# Altium footprint library S61.PcbLib: 33 footprints (part 1 of 3)
Each footprint in its own frame and in the unit in brackets; x right, y up, seen from the top. Pads: shape width x height; smd on the part's side, far side on the other; paste and mask are expansions set on the pad; w line width, h text height; cw(c..) or ccw(c..) is an arc to the next point about the centre after c.
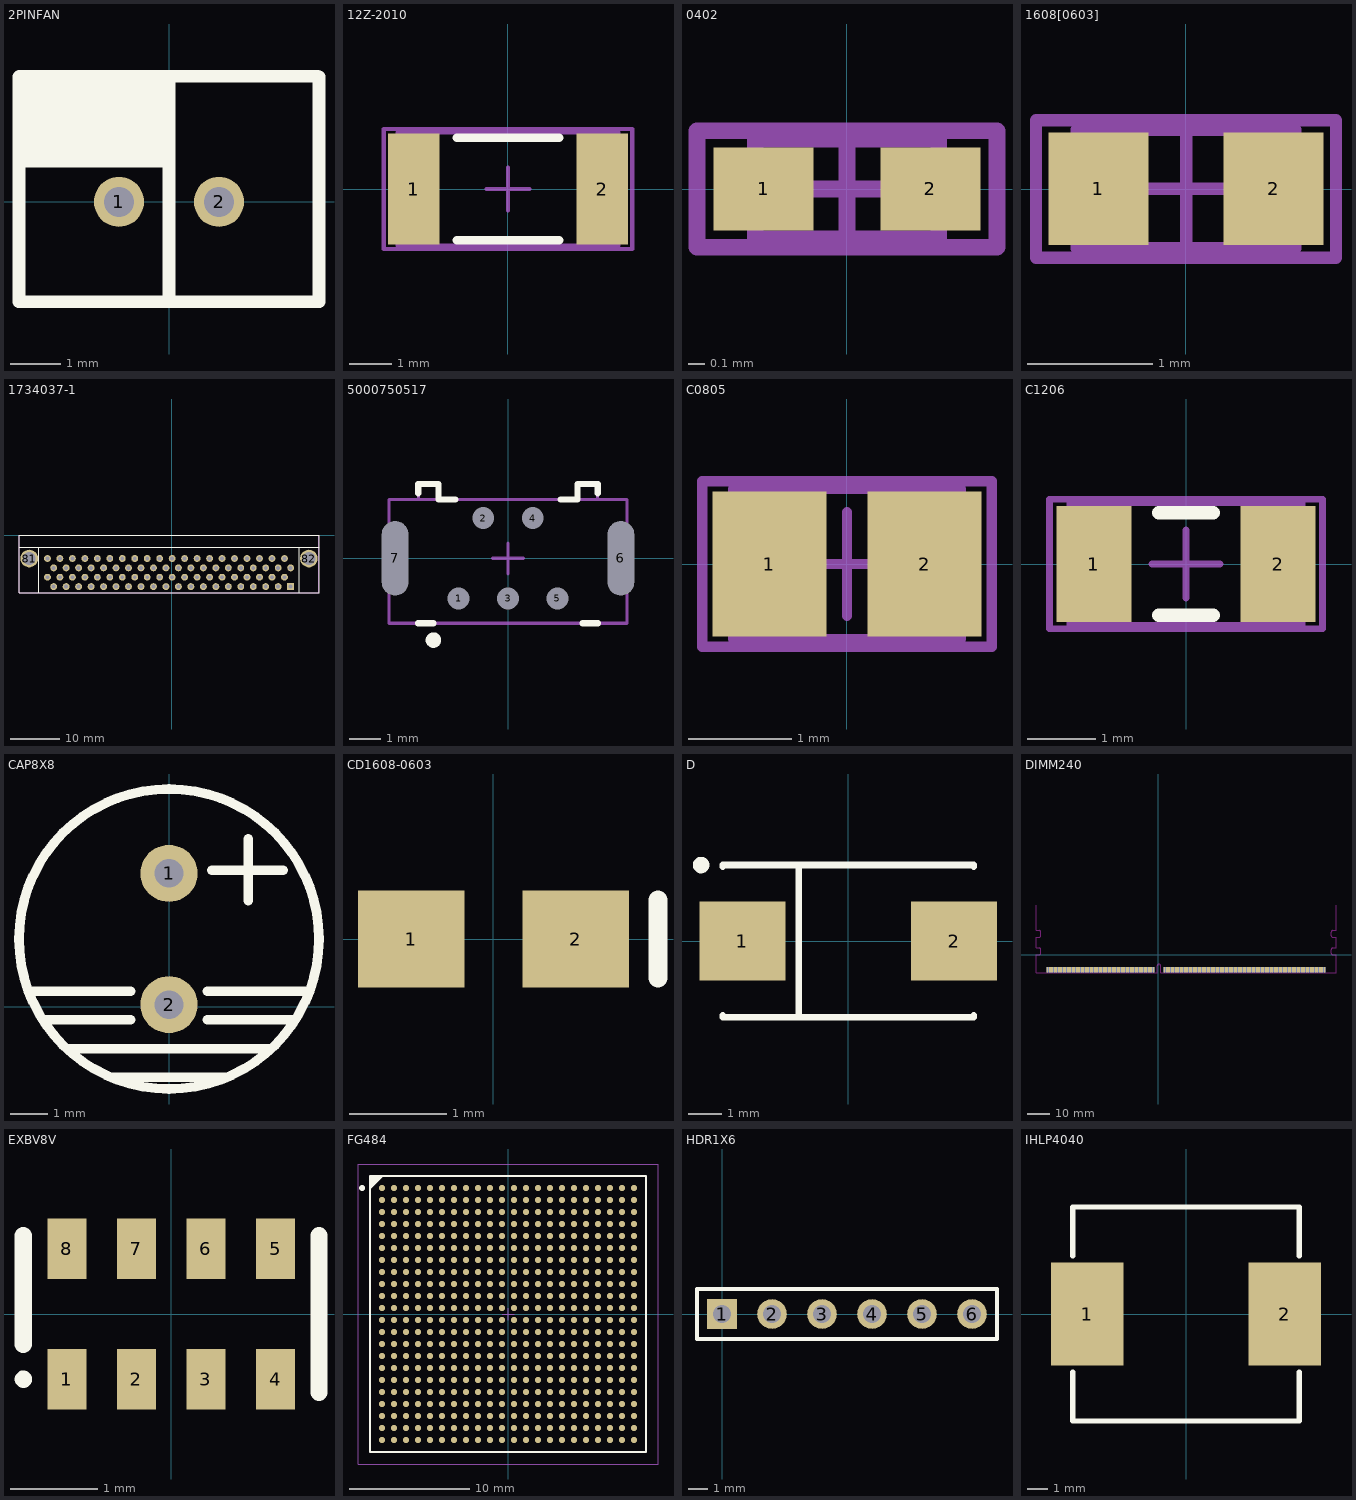
[diagram p0: the footprints below, top view; thin cyan lines are the x and y axes]

## 2PINFAN [mm]
pads (2):
  round 1 hole 0.6: 1(-1,0) 2(1,0)
Top Overlay:
  rectangle: -2.997,0.686 -0.025,2.489
  lines w0.254: -3,2.5 -3,-2 3,-2 3,2.5 ; -2.997,2.515 2.972,2.515 ; 0,-1.956 0,2.464

## 12Z-2010 [mm] "Chip Resistor, Body 5.0x2.5mm, IPC High Density"
height 0.9
pads (2):
  rect 1.2x2.6 smd: 1(-2.2,0) 2(2.2,0)
Top Overlay:
  lines w0.2: -1.2,-1.2 1.2,-1.2 ; -1.2,1.2 1.2,1.2
Mechanical 13:
  lines w0.1: -2.575,-1.325 -2.575,1.325 2.575,1.325 2.575,-1.325 -2.575,-1.325
Mechanical 15:
  lines w0.1: -0.5,0 0.5,0 ; 0,-0.5 0,0.5 ; -2.9,-1.4 -2.9,1.4 2.9,1.4 2.9,-1.4 -2.9,-1.4
3D body: height 0.9, standoff 0, extent -2.575,-1.325 2.575,1.325

## 0402 [mm] "Chip Capacitor, Body 1.0x0.5mm, IPC High Density"
height 1.3
pads (2):
  rect 0.6x0.5 smd: 1(-0.5,0) 2(0.5,0)
Mechanical 13:
  lines w0.1: -0.55,-0.3 -0.55,0.3 0.55,0.3 0.55,-0.3 -0.55,-0.3
Mechanical 15:
  lines w0.1: -0.3,0 0.3,0 ; 0,-0.3 0,0.3 ; -0.9,-0.35 -0.9,0.35 0.9,0.35 0.9,-0.35 -0.9,-0.35
3D body: height 1.3, standoff 0, extent -0.55,-0.3 0.55,0.3

## 1608[0603] [mm] "Chip Capacitor, Body 1.6x0.8mm, IPC High Density"
height 1.3
pads (2):
  rect 0.8x0.9 smd: 1(-0.7,0) 2(0.7,0)
Mechanical 13:
  lines w0.1: -0.875,-0.475 -0.875,0.475 0.875,0.475 0.875,-0.475 -0.875,-0.475
Mechanical 15:
  lines w0.1: -0.475,0 0.475,0 ; 0,-0.475 0,0.475 ; -1.2,-0.55 -1.2,0.55 1.2,0.55 1.2,-0.55 -1.2,-0.55
3D body: height 1.3, standoff 0, extent -0.875,-0.475 0.875,0.475

## 1734037-1 [mm]
pads (82):
  rect 1.4x1.4 hole 0.8: 1(24.257,-10.5)
  round 1.4 hole 0.8: 2(22.987,-8.595) 3(21.717,-10.5) 4(20.447,-8.595) 5(19.177,-10.5) 6(17.907,-8.595) 7(16.637,-10.5) 8(15.367,-8.595) 9(14.097,-10.5) 10(12.827,-8.595) 11(11.557,-10.5) 12(10.287,-8.595) 13(9.017,-10.5) 14(7.747,-8.595) 15(6.477,-10.5) 16(5.207,-8.595) 17(3.937,-10.5) 18(2.667,-8.595) 19(1.397,-10.5) 20(0.127,-8.595) 21(-1.143,-10.5) 22(-2.413,-8.595) 23(-3.683,-10.5) 24(-4.953,-8.595) 25(-6.223,-10.5) 26(-7.493,-8.595) 27(-8.763,-10.5) 28(-10.033,-8.595) 29(-11.303,-10.5) 30(-12.573,-8.595) 31(-13.843,-10.5) 32(-15.113,-8.595) 33(-16.383,-10.5) 34(-17.653,-8.595) 35(-18.923,-10.5) 36(-20.193,-8.595) 37(-21.463,-10.5) 38(-22.733,-8.595) 39(-24.003,-10.5) 40(-25.273,-8.595) 41(24.257,-6.69) 42(22.987,-4.785) 43(21.717,-6.69) 44(20.447,-4.785) 45(19.177,-6.69) 46(17.907,-4.785) 47(16.637,-6.69) 48(15.367,-4.785) 49(14.097,-6.69) 50(12.827,-4.785) 51(11.557,-6.69) 52(10.287,-4.785) 53(9.017,-6.69) 54(7.747,-4.785) 55(6.477,-6.69) 56(5.207,-4.785) 57(3.937,-6.69) 58(2.667,-4.785) 59(1.397,-6.69) 60(0.127,-4.785) 61(-1.143,-6.69) 62(-2.413,-4.785) 63(-3.683,-6.69) 64(-4.953,-4.785) 65(-6.223,-6.69) 66(-7.493,-4.785) 67(-8.763,-6.69) 68(-10.033,-4.785) 69(-11.303,-6.69) 70(-12.573,-4.785) 71(-13.843,-6.69) 72(-15.113,-4.785) 73(-16.383,-6.69) 74(-17.653,-4.785) 75(-18.923,-6.69) 76(-20.193,-4.785) 77(-21.463,-6.69) 78(-22.733,-4.785) 79(-24.003,-6.69) 80(-25.273,-4.785)
  round 3.6 hole 2.6: 81(-28.981,-4.785) 82(27.965,-4.785)
Top Overlay:
  lines w0.2: -31.039,-2.5 30.023,-2.5 ; -27.028,-11.8 -27.028,-2.58 ; 26.012,-11.8 26.012,-2.5 ; -31.039,-11.8 -31.039,0 30.023,0 30.023,-11.8 -31.039,-11.8
Mechanical 13:
  lines w0.1: -31.064,-2.5 30.023,-2.5 ; -31.039,0 29.972,0 ; -31.039,0 29.972,0 ; -31.039,0 -31.039,-11.8 29.972,-11.8 29.972,0

## 5000750517 [mm] "Connector; USB Mini-B, Type 2, Thru-Hole; 5 Position; Vertical"
height 7.7
pads (7):
  round 0.4 / inner round 0.4 / far side oval 1.1x1.7 hole 0.7: 1(-1.6,-1.3) 2(-0.8,1.3) 3(0,-1.3) 4(0.8,1.3) 5(1.6,-1.3)
  oval 0.55x2.1 / inner oval 0.55x2.1 / far side oval 1.6x3.9 hole 0.85 slot 2.4 at 90 deg: 6(3.65,0) 7(-3.65,0)
Top Overlay:
  circle w0.25: c-2.41,-2.645 r0.125
  lines w0.2: -2.91,-2.1 -2.41,-2.1 ; -2.9,2.1 -2.9,2.4 -2.25,2.4 -2.25,1.9 -1.7,1.9 ; 1.7,1.9 2.25,1.9 2.25,2.4 2.9,2.4 2.9,2.1 ; 2.41,-2.1 2.91,-2.1
Mechanical 13:
  lines w0.1: -2.9,1.9 -2.9,2.4 -2.25,2.4 -2.25,1.9 ; 2.25,1.9 2.25,2.4 2.9,2.4 2.9,1.9 ; -3.85,-2.1 -3.85,1.9 3.85,1.9 3.85,-2.1 -3.85,-2.1
Mechanical 15:
  lines w0.1: -0.5,0 0.5,0 ; 0,-0.5 0,0.5
3D body: height 7.7, standoff 0, extent -3.849,-2.099 3.849,1.899
3D body: height 7.7, standoff 0, extent -2.899,1.901 -2.251,2.399
3D body: height 7.7, standoff 0, extent 2.251,1.901 2.899,2.399

## C0805 [mm] "Chip Capacitor, Body 2.0x1.3mm, IPC High Density"
height 1.4
pads (2):
  rect 1.1x1.4 smd: 1(-0.75,0) 2(0.75,0)
Mechanical 13:
  lines w0.1: -1.1,-0.725 1.1,-0.725 1.1,0.725 -1.1,0.725 -1.1,-0.725
Mechanical 15:
  lines w0.1: -0.5,0 0.5,0 ; 0,-0.5 0,0.5 ; -1.4,-0.8 1.4,-0.8 1.4,0.8 -1.4,0.8 -1.4,-0.8
3D body: height 1.4, standoff 0, extent -1.1,-0.725 1.1,0.725

## C1206 [mm] "Chip Capacitor, Body 3.2x1.6mm, IPC High Density"
height 1.3
pads (2):
  rect 1.1x1.7 smd: 1(-1.35,0) 2(1.35,0)
Top Overlay:
  lines w0.2: -0.4,-0.75 0.4,-0.75 ; -0.4,0.75 0.4,0.75
Mechanical 13:
  lines w0.1: -1.7,-0.9 1.7,-0.9 1.7,0.9 -1.7,0.9 -1.7,-0.9
Mechanical 15:
  lines w0.1: -0.5,0 0.5,0 ; 0,-0.5 0,0.5 ; -2,-0.95 2,-0.95 2,0.95 -2,0.95 -2,-0.95
3D body: height 1.3, standoff 0, extent -1.7,-0.9 1.7,0.9

## CAP8X8 [mil]
pads (2):
  round 60 hole 30: 1(0,140) 2(0,2.2)
Top Overlay:
  circle w10: c0,71.1 r157.48
  lines w10: -145,16.1 -40,16.1 ; -130,-13.9 -40,-13.9 ; -105,-43.9 105,-43.9 ; -60,-73.9 60,-73.9 ; 40,-13.9 130,-13.9 ; 40,16.1 145,16.1 ; 45,143.1 120,143.1 ; 83,111.1 83,176.1

## CD1608-0603 [mm] "Chip Diode; Body 1.6 x 0.8 mm (LxW typ)"
height 0.85
pads (2):
  rect 1.1x1 smd: 1(-0.85,0) 2(0.85,0)
Top Overlay:
  lines w0.2: 1.7,-0.4 1.7,0.4

## D [mm] "Capacitor, SM Tantalum; Body 7.3 x 4.3 mm (LxW typ)"
height 3.1
pads (2):
  rect 2.6x2.4 smd: 1(-3.2,0) 2(3.2,0)
Top Overlay:
  circle w0.25: c-4.45,2.3 r0.125
  lines w0.2: -3.8,-2.25 -3.8,-2.3 3.8,-2.3 3.8,-2.25 ; -3.8,2.25 -3.8,2.3 3.8,2.3 3.8,2.25 ; -1.5,-2.3 -1.5,2.3

## DIMM240 [mm]
pads (240):
  rect 0.8x2.3 smd: 1(-49.069,-6.64) 2(-48.069,-6.64) 3(-47.069,-6.64) 4(-46.069,-6.64) 5(-45.069,-6.64) 6(-44.069,-6.64) 7(-43.069,-6.64) 8(-42.069,-6.64) 9(-41.069,-6.64) 10(-40.069,-6.64) 11(-39.069,-6.64) 12(-38.069,-6.64) 13(-37.069,-6.64) 14(-36.069,-6.64) 15(-35.069,-6.64) 16(-34.069,-6.64) 17(-33.069,-6.64) 18(-32.069,-6.64) 19(-31.069,-6.64) 20(-30.069,-6.64) 21(-29.069,-6.64) 22(-28.069,-6.64) 23(-27.069,-6.64) 24(-26.069,-6.64) 25(-25.069,-6.64) 26(-24.069,-6.64) 27(-23.069,-6.64) 28(-22.069,-6.64) 29(-21.069,-6.64) 30(-20.069,-6.64) 31(-19.069,-6.64) 32(-18.069,-6.64) 33(-17.069,-6.64) 34(-16.069,-6.64) 35(-15.069,-6.64) 36(-14.069,-6.64) 37(-13.069,-6.64) 38(-12.069,-6.64) 39(-11.069,-6.64) 40(-10.069,-6.64) 41(-9.069,-6.64) 42(-8.069,-6.64) 43(-7.069,-6.64) 44(-6.069,-6.64) 45(-5.069,-6.64) 46(-4.069,-6.64) 47(-3.069,-6.64) 48(-2.069,-6.64) 49(2.931,-6.64) 50(3.931,-6.64) 51(4.931,-6.64) 52(5.931,-6.64) 53(6.931,-6.64) 54(7.931,-6.64) 55(8.931,-6.64) 56(9.931,-6.64) 57(10.931,-6.64) 58(11.931,-6.64) 59(12.931,-6.64) 60(13.931,-6.64) 61(14.931,-6.64) 62(15.931,-6.64) 63(16.931,-6.64) 64(17.931,-6.64) 65(18.931,-6.64) 66(19.931,-6.64) 67(20.931,-6.64) 68(21.931,-6.64) 69(22.931,-6.64) 70(23.931,-6.64) 71(24.931,-6.64) 72(25.931,-6.64) 73(26.931,-6.64) 74(27.931,-6.64) 75(28.931,-6.64) 76(29.931,-6.64) 77(30.931,-6.64) 78(31.931,-6.64) 79(32.931,-6.64) 80(33.931,-6.64) 81(34.931,-6.64) 82(35.931,-6.64) 83(36.931,-6.64) 84(37.931,-6.64) 85(38.931,-6.64) 86(39.931,-6.64) 87(40.931,-6.64) 88(41.931,-6.64) 89(42.931,-6.64) 90(43.931,-6.64) 91(44.931,-6.64) 92(45.931,-6.64) 93(46.931,-6.64) 94(47.931,-6.64) 95(48.931,-6.64) 96(49.931,-6.64) 97(50.931,-6.64) 98(51.931,-6.64) 99(52.931,-6.64) 100(53.931,-6.64) 101(54.931,-6.64) 102(55.931,-6.64) 103(56.931,-6.64) 104(57.931,-6.64) 105(58.931,-6.64) 106(59.931,-6.64) 107(60.931,-6.64) 108(61.931,-6.64) 109(62.931,-6.64) 110(63.931,-6.64) 111(64.931,-6.64) 112(65.931,-6.64) 113(66.931,-6.64) 114(67.931,-6.64) 115(68.931,-6.64) 116(69.931,-6.64) 117(70.931,-6.64) 118(71.931,-6.64) 119(72.931,-6.64) 120(73.931,-6.64)
  rect 0.8x2.3 smd far side: 121(-49.069,-6.64) 122(-48.069,-6.64) 123(-47.069,-6.64) 124(-46.069,-6.64) 125(-45.069,-6.64) 126(-44.069,-6.64) 127(-43.069,-6.64) 128(-42.069,-6.64) 129(-41.069,-6.64) 130(-40.069,-6.64) 131(-39.069,-6.64) 132(-38.069,-6.64) 133(-37.069,-6.64) 134(-36.069,-6.64) 135(-35.069,-6.64) 136(-34.069,-6.64) 137(-33.069,-6.64) 138(-32.069,-6.64) 139(-31.069,-6.64) 140(-30.069,-6.64) 141(-29.069,-6.64) 142(-28.069,-6.64) 143(-27.069,-6.64) 144(-26.069,-6.64) 145(-25.069,-6.64) 146(-24.069,-6.64) 147(-23.069,-6.64) 148(-22.069,-6.64) 149(-21.069,-6.64) 150(-20.069,-6.64) 151(-19.069,-6.64) 152(-18.069,-6.64) 153(-17.069,-6.64) 154(-16.069,-6.64) 155(-15.069,-6.64) 156(-14.069,-6.64) 157(-13.069,-6.64) 158(-12.069,-6.64) 159(-11.069,-6.64) 160(-10.069,-6.64) 161(-9.069,-6.64) 162(-8.069,-6.64) 163(-7.069,-6.64) 164(-6.069,-6.64) 165(-5.069,-6.64) 166(-4.069,-6.64) 167(-3.069,-6.64) 168(-2.069,-6.64) 169(2.931,-6.64) 170(3.931,-6.64) 171(4.931,-6.64) 172(5.931,-6.64) 173(6.931,-6.64) 174(7.931,-6.64) 175(8.931,-6.64) 176(9.931,-6.64) 177(10.931,-6.64) 178(11.931,-6.64) 179(12.931,-6.64) 180(13.931,-6.64) 181(14.931,-6.64) 182(15.931,-6.64) 183(16.931,-6.64) 184(17.931,-6.64) 185(18.931,-6.64) 186(19.931,-6.64) 187(20.931,-6.64) 188(21.931,-6.64) 189(22.931,-6.64) 190(23.931,-6.64) 191(24.931,-6.64) 192(25.931,-6.64) 193(26.931,-6.64) 194(27.931,-6.64) 195(28.931,-6.64) 196(29.931,-6.64) 197(30.931,-6.64) 198(31.931,-6.64) 199(32.931,-6.64) 200(33.931,-6.64) 201(34.931,-6.64) 202(35.931,-6.64) 203(36.931,-6.64) 204(37.931,-6.64) 205(38.931,-6.64) 206(39.931,-6.64) 207(40.931,-6.64) 208(41.931,-6.64) 209(42.931,-6.64) 210(43.931,-6.64) 211(44.931,-6.64) 212(45.931,-6.64) 213(46.931,-6.64) 214(47.931,-6.64) 215(48.931,-6.64) 216(49.931,-6.64) 217(50.931,-6.64) 218(51.931,-6.64) 219(52.931,-6.64) 220(53.931,-6.64) 221(54.931,-6.64) 222(55.931,-6.64) 223(56.931,-6.64) 224(57.931,-6.64) 225(58.931,-6.64) 226(59.931,-6.64) 227(60.931,-6.64) 228(61.931,-6.64) 229(62.931,-6.64) 230(63.931,-6.64) 231(64.931,-6.64) 232(65.931,-6.64) 233(66.931,-6.64) 234(67.931,-6.64) 235(68.931,-6.64) 236(69.931,-6.64) 237(70.931,-6.64) 238(71.931,-6.64) 239(72.931,-6.64) 240(73.931,-6.64)
Top Layer:
  rectangle: -49.269,-7.99 -48.869,-7.79
  region: -48.869,-7.79 -49.269,-7.79 -49.269,-7.99 -48.869,-7.99
  rectangle: -48.269,-7.99 -47.869,-7.79
  region: -47.869,-7.79 -48.269,-7.79 -48.269,-7.99 -47.869,-7.99
  rectangle: -47.269,-7.99 -46.869,-7.79
  region: -46.869,-7.79 -47.269,-7.79 -47.269,-7.99 -46.869,-7.99
  rectangle: -46.269,-7.99 -45.869,-7.79
  region: -45.869,-7.79 -46.269,-7.79 -46.269,-7.99 -45.869,-7.99
  rectangle: -45.269,-7.99 -44.869,-7.79
  region: -44.869,-7.79 -45.269,-7.79 -45.269,-7.99 -44.869,-7.99
  rectangle: -44.269,-7.99 -43.869,-7.79
  region: -43.869,-7.79 -44.269,-7.79 -44.269,-7.99 -43.869,-7.99
  rectangle: -43.269,-7.99 -42.869,-7.79
  region: -42.869,-7.79 -43.269,-7.79 -43.269,-7.99 -42.869,-7.99
  rectangle: -42.269,-7.99 -41.869,-7.79
  region: -41.869,-7.79 -42.269,-7.79 -42.269,-7.99 -41.869,-7.99
  rectangle: -41.269,-7.989 -40.869,-7.789
  region: -40.869,-7.789 -41.269,-7.789 -41.269,-7.989 -40.869,-7.989
  rectangle: -40.269,-7.99 -39.869,-7.79
  region: -39.869,-7.79 -40.269,-7.79 -40.269,-7.99 -39.869,-7.99
  rectangle: -39.269,-7.99 -38.869,-7.79
  region: -38.869,-7.79 -39.269,-7.79 -39.269,-7.99 -38.869,-7.99
  rectangle: -38.269,-7.99 -37.869,-7.79
  region: -37.869,-7.79 -38.269,-7.79 -38.269,-7.99 -37.869,-7.99
  rectangle: -37.269,-7.99 -36.869,-7.79
  region: -36.869,-7.79 -37.269,-7.79 -37.269,-7.99 -36.869,-7.99
  rectangle: -36.269,-7.99 -35.869,-7.79
  region: -35.869,-7.79 -36.269,-7.79 -36.269,-7.99 -35.869,-7.99
  rectangle: -35.269,-7.99 -34.869,-7.79
  region: -34.869,-7.79 -35.269,-7.79 -35.269,-7.99 -34.869,-7.99
  rectangle: -34.269,-7.99 -33.869,-7.79
  region: -33.869,-7.79 -34.269,-7.79 -34.269,-7.99 -33.869,-7.99
  rectangle: -33.269,-7.99 -32.869,-7.79
  region: -32.869,-7.79 -33.269,-7.79 -33.269,-7.99 -32.869,-7.99
  rectangle: -32.269,-7.99 -31.869,-7.79
  region: -31.869,-7.79 -32.269,-7.79 -32.269,-7.99 -31.869,-7.99
  rectangle: -31.269,-7.99 -30.869,-7.79
  region: -30.869,-7.79 -31.269,-7.79 -31.269,-7.99 -30.869,-7.99
  rectangle: -30.269,-7.99 -29.869,-7.79
  region: -29.869,-7.79 -30.269,-7.79 -30.269,-7.99 -29.869,-7.99
  rectangle: -29.269,-7.99 -28.869,-7.79
  region: -28.869,-7.79 -29.269,-7.79 -29.269,-7.99 -28.869,-7.99
  rectangle: -28.269,-7.99 -27.869,-7.79
  region: -27.869,-7.79 -28.269,-7.79 -28.269,-7.99 -27.869,-7.99
  rectangle: -27.269,-7.99 -26.869,-7.79
  region: -26.869,-7.79 -27.269,-7.79 -27.269,-7.99 -26.869,-7.99
  rectangle: -26.269,-7.99 -25.869,-7.79
  region: -25.869,-7.79 -26.269,-7.79 -26.269,-7.99 -25.869,-7.99
  rectangle: -25.269,-7.99 -24.869,-7.79
  region: -24.869,-7.79 -25.269,-7.79 -25.269,-7.99 -24.869,-7.99
  rectangle: -24.269,-7.99 -23.869,-7.79
  region: -23.869,-7.79 -24.269,-7.79 -24.269,-7.99 -23.869,-7.99
  rectangle: -23.269,-7.99 -22.869,-7.79
  region: -22.869,-7.79 -23.269,-7.79 -23.269,-7.99 -22.869,-7.99
  rectangle: -22.269,-7.99 -21.869,-7.79
  region: -21.869,-7.79 -22.269,-7.79 -22.269,-7.99 -21.869,-7.99
  rectangle: -21.269,-7.99 -20.869,-7.79
  region: -20.869,-7.79 -21.269,-7.79 -21.269,-7.99 -20.869,-7.99
  rectangle: -20.269,-7.99 -19.869,-7.79
  region: -19.869,-7.79 -20.269,-7.79 -20.269,-7.99 -19.869,-7.99
  rectangle: -19.269,-7.99 -18.869,-7.79
  region: -18.869,-7.79 -19.269,-7.79 -19.269,-7.99 -18.869,-7.99
  rectangle: -18.269,-7.99 -17.869,-7.79
  region: -17.869,-7.79 -18.269,-7.79 -18.269,-7.99 -17.869,-7.99
  rectangle: -17.269,-7.99 -16.869,-7.79
  region: -16.869,-7.79 -17.269,-7.79 -17.269,-7.99 -16.869,-7.99
  rectangle: -16.269,-7.99 -15.869,-7.79
  region: -15.869,-7.79 -16.269,-7.79 -16.269,-7.99 -15.869,-7.99
  rectangle: -15.269,-7.99 -14.869,-7.79
  region: -14.869,-7.79 -15.269,-7.79 -15.269,-7.99 -14.869,-7.99
  rectangle: -14.269,-7.99 -13.869,-7.79
  region: -13.869,-7.79 -14.269,-7.79 -14.269,-7.99 -13.869,-7.99
  rectangle: -13.269,-7.99 -12.869,-7.79
  region: -12.869,-7.79 -13.269,-7.79 -13.269,-7.99 -12.869,-7.99
  rectangle: -12.269,-7.99 -11.869,-7.79
  region: -11.869,-7.79 -12.269,-7.79 -12.269,-7.99 -11.869,-7.99
  rectangle: -11.269,-7.99 -10.869,-7.79
  region: -10.869,-7.79 -11.269,-7.79 -11.269,-7.99 -10.869,-7.99
  rectangle: -10.269,-7.99 -9.869,-7.79
  region: -9.869,-7.79 -10.269,-7.79 -10.269,-7.99 -9.869,-7.99
  rectangle: -9.269,-7.99 -8.869,-7.79
  region: -8.869,-7.79 -9.269,-7.79 -9.269,-7.99 -8.869,-7.99
  rectangle: -8.269,-7.99 -7.869,-7.79
  region: -7.869,-7.79 -8.269,-7.79 -8.269,-7.99 -7.869,-7.99
  rectangle: -7.269,-7.99 -6.869,-7.79
  region: -6.869,-7.79 -7.269,-7.79 -7.269,-7.99 -6.869,-7.99
  rectangle: -6.269,-7.99 -5.869,-7.79
  region: -5.869,-7.79 -6.269,-7.79 -6.269,-7.99 -5.869,-7.99
  rectangle: -5.269,-7.99 -4.869,-7.79
  region: -4.869,-7.79 -5.269,-7.79 -5.269,-7.99 -4.869,-7.99
  rectangle: -4.269,-7.99 -3.869,-7.79
  region: -3.869,-7.79 -4.269,-7.79 -4.269,-7.99 -3.869,-7.99
  rectangle: -3.269,-7.99 -2.869,-7.79
  region: -2.869,-7.79 -3.269,-7.79 -3.269,-7.99 -2.869,-7.99
  rectangle: -2.269,-7.99 -1.869,-7.79
  region: -1.869,-7.79 -2.269,-7.79 -2.269,-7.99 -1.869,-7.99
  rectangle: 2.73,-7.99 3.131,-7.79
  region: 3.131,-7.79 2.73,-7.79 2.73,-7.99 3.131,-7.99
  rectangle: 3.73,-7.99 4.131,-7.79
  region: 4.131,-7.79 3.73,-7.79 3.73,-7.99 4.131,-7.99
  rectangle: 4.73,-7.99 5.131,-7.79
  region: 5.131,-7.79 4.73,-7.79 4.73,-7.99 5.131,-7.99
  rectangle: 5.73,-7.99 6.131,-7.79
  region: 6.131,-7.79 5.73,-7.79 5.73,-7.99 6.131,-7.99
  rectangle: 6.73,-7.99 7.131,-7.79
  region: 7.131,-7.79 6.73,-7.79 6.73,-7.99 7.131,-7.99
  rectangle: 7.73,-7.99 8.131,-7.79
  region: 8.131,-7.79 7.73,-7.79 7.73,-7.99 8.131,-7.99
  rectangle: 8.73,-7.99 9.131,-7.79
  region: 9.131,-7.79 8.73,-7.79 8.73,-7.99 9.131,-7.99
  rectangle: 9.73,-7.99 10.131,-7.79
  region: 10.131,-7.79 9.73,-7.79 9.73,-7.99 10.131,-7.99
  rectangle: 10.73,-7.99 11.131,-7.79
  region: 11.131,-7.79 10.73,-7.79 10.73,-7.99 11.131,-7.99
  rectangle: 11.73,-7.99 12.131,-7.79
  region: 12.131,-7.79 11.73,-7.79 11.73,-7.99 12.131,-7.99
  rectangle: 12.73,-7.99 13.131,-7.79
  region: 13.131,-7.79 12.73,-7.79 12.73,-7.99 13.131,-7.99
  rectangle: 13.73,-7.99 14.131,-7.79
  region: 14.131,-7.79 13.73,-7.79 13.73,-7.99 14.131,-7.99
  rectangle: 14.73,-7.99 15.131,-7.79
  region: 15.131,-7.79 14.73,-7.79 14.73,-7.99 15.131,-7.99
  rectangle: 15.73,-7.99 16.131,-7.79
  region: 16.131,-7.79 15.73,-7.79 15.73,-7.99 16.131,-7.99
  rectangle: 16.731,-7.99 17.131,-7.79
  region: 17.131,-7.79 16.731,-7.79 16.731,-7.99 17.131,-7.99
  rectangle: 17.731,-7.99 18.131,-7.79
  region: 18.131,-7.79 17.731,-7.79 17.731,-7.99 18.131,-7.99
  rectangle: 18.731,-7.99 19.131,-7.79
  region: 19.131,-7.79 18.731,-7.79 18.731,-7.99 19.131,-7.99
  rectangle: 19.731,-7.99 20.131,-7.79
  region: 20.131,-7.79 19.731,-7.79 19.731,-7.99 20.131,-7.99
  rectangle: 20.731,-7.99 21.131,-7.79
  region: 21.131,-7.79 20.731,-7.79 20.731,-7.99 21.131,-7.99
  rectangle: 21.731,-7.99 22.131,-7.79
  region: 22.131,-7.79 21.731,-7.79 21.731,-7.99 22.131,-7.99
  rectangle: 22.731,-7.99 23.131,-7.79
  region: 23.131,-7.79 22.731,-7.79 22.731,-7.99 23.131,-7.99
  rectangle: 23.731,-7.99 24.131,-7.79
  region: 24.131,-7.79 23.731,-7.79 23.731,-7.99 24.131,-7.99
  rectangle: 24.731,-7.99 25.131,-7.79
  region: 25.131,-7.79 24.731,-7.79 24.731,-7.99 25.131,-7.99
  rectangle: 25.731,-7.99 26.131,-7.79
  region: 26.131,-7.79 25.731,-7.79 25.731,-7.99 26.131,-7.99
  rectangle: 26.731,-7.99 27.131,-7.79
  region: 27.131,-7.79 26.731,-7.79 26.731,-7.99 27.131,-7.99
  rectangle: 27.731,-7.99 28.13,-7.79
  region: 28.13,-7.79 27.731,-7.79 27.731,-7.99 28.13,-7.99
  rectangle: 28.731,-7.99 29.13,-7.79
  region: 29.13,-7.79 28.731,-7.79 28.731,-7.99 29.13,-7.99
  rectangle: 29.731,-7.99 30.13,-7.79
  region: 30.13,-7.79 29.731,-7.79 29.731,-7.99 30.13,-7.99
  rectangle: 30.731,-7.99 31.13,-7.79
  region: 31.13,-7.79 30.731,-7.79 30.731,-7.99 31.13,-7.99
  rectangle: 31.731,-7.99 32.13,-7.79
  region: 32.13,-7.79 31.731,-7.79 31.731,-7.99 32.13,-7.99
  rectangle: 32.731,-7.99 33.13,-7.79
  region: 33.13,-7.79 32.731,-7.79 32.731,-7.99 33.13,-7.99
  rectangle: 33.731,-7.99 34.13,-7.79
  region: 34.13,-7.79 33.731,-7.79 33.731,-7.99 34.13,-7.99
  rectangle: 34.731,-7.99 35.13,-7.79
  region: 35.13,-7.79 34.731,-7.79 34.731,-7.99 35.13,-7.99
  rectangle: 35.731,-7.99 36.13,-7.79
  region: 36.13,-7.79 35.731,-7.79 35.731,-7.99 36.13,-7.99
  rectangle: 36.731,-7.99 37.13,-7.79
  region: 37.13,-7.79 36.731,-7.79 36.731,-7.99 37.13,-7.99
  rectangle: 37.731,-7.99 38.13,-7.79
  region: 38.13,-7.79 37.731,-7.79 37.731,-7.99 38.13,-7.99
  rectangle: 38.731,-7.99 39.13,-7.79
  region: 39.13,-7.79 38.731,-7.79 38.731,-7.99 39.13,-7.99
  rectangle: 39.731,-7.99 40.13,-7.79
  region: 40.13,-7.79 39.731,-7.79 39.731,-7.99 40.13,-7.99
  rectangle: 40.731,-7.99 41.13,-7.79
  region: 41.13,-7.79 40.731,-7.79 40.731,-7.99 41.13,-7.99
  rectangle: 41.731,-7.99 42.131,-7.79
  region: 42.131,-7.79 41.731,-7.79 41.731,-7.99 42.131,-7.99
  rectangle: 42.731,-7.99 43.131,-7.79
  region: 43.131,-7.79 42.731,-7.79 42.731,-7.99 43.131,-7.99
  rectangle: 43.731,-7.99 44.131,-7.79
  region: 44.131,-7.79 43.731,-7.79 43.731,-7.99 44.131,-7.99
  rectangle: 44.731,-7.99 45.131,-7.79
  region: 45.131,-7.79 44.731,-7.79 44.731,-7.99 45.131,-7.99
  rectangle: 45.731,-7.99 46.131,-7.79
  region: 46.131,-7.79 45.731,-7.79 45.731,-7.99 46.131,-7.99
  rectangle: 46.731,-7.99 47.131,-7.79
  region: 47.131,-7.79 46.731,-7.79 46.731,-7.99 47.131,-7.99
  rectangle: 47.731,-7.99 48.131,-7.79
  region: 48.131,-7.79 47.731,-7.79 47.731,-7.99 48.131,-7.99
  rectangle: 48.731,-7.99 49.131,-7.79
  region: 49.131,-7.79 48.731,-7.79 48.731,-7.99 49.131,-7.99
  rectangle: 49.731,-7.99 50.131,-7.79
  region: 50.131,-7.79 49.731,-7.79 49.731,-7.99 50.131,-7.99
  rectangle: 50.731,-7.99 51.131,-7.79
  region: 51.131,-7.79 50.731,-7.79 50.731,-7.99 51.131,-7.99
  rectangle: 51.731,-7.99 52.131,-7.79
  region: 52.131,-7.79 51.731,-7.79 51.731,-7.99 52.131,-7.99
  rectangle: 52.731,-7.99 53.131,-7.79
  region: 53.131,-7.79 52.731,-7.79 52.731,-7.99 53.131,-7.99
  rectangle: 53.731,-7.99 54.131,-7.79
  region: 54.131,-7.79 53.731,-7.79 53.731,-7.99 54.131,-7.99
  rectangle: 54.731,-7.99 55.131,-7.79
  region: 55.131,-7.79 54.731,-7.79 54.731,-7.99 55.131,-7.99
  rectangle: 55.731,-7.99 56.131,-7.79
  region: 56.131,-7.79 55.731,-7.79 55.731,-7.99 56.131,-7.99
  rectangle: 56.731,-7.99 57.131,-7.79
  region: 57.131,-7.79 56.731,-7.79 56.731,-7.99 57.131,-7.99
  rectangle: 57.731,-7.99 58.131,-7.79
  region: 58.131,-7.79 57.731,-7.79 57.731,-7.99 58.131,-7.99
  rectangle: 58.731,-7.99 59.131,-7.79
  region: 59.131,-7.79 58.731,-7.79 58.731,-7.99 59.131,-7.99
  rectangle: 59.731,-7.99 60.131,-7.79
  region: 60.131,-7.79 59.731,-7.79 59.731,-7.99 60.131,-7.99
  rectangle: 60.731,-7.99 61.131,-7.79
  region: 61.131,-7.79 60.731,-7.79 60.731,-7.99 61.131,-7.99
  rectangle: 61.731,-7.99 62.131,-7.79
  region: 62.131,-7.79 61.731,-7.79 61.731,-7.99 62.131,-7.99
  rectangle: 62.731,-7.99 63.131,-7.79
  region: 63.131,-7.79 62.731,-7.79 62.731,-7.99 63.131,-7.99
  rectangle: 63.731,-7.99 64.131,-7.79
  region: 64.131,-7.79 63.731,-7.79 63.731,-7.99 64.131,-7.99
  rectangle: 64.731,-7.99 65.131,-7.79
  region: 65.131,-7.79 64.731,-7.79 64.731,-7.99 65.131,-7.99
  rectangle: 65.731,-7.99 66.131,-7.79
  region: 66.131,-7.79 65.731,-7.79 65.731,-7.99 66.131,-7.99
  rectangle: 66.731,-7.99 67.131,-7.79
  region: 67.131,-7.79 66.731,-7.79 66.731,-7.99 67.131,-7.99
  rectangle: 67.731,-7.99 68.131,-7.79
  region: 68.131,-7.79 67.731,-7.79 67.731,-7.99 68.131,-7.99
  rectangle: 68.731,-7.99 69.131,-7.79
  region: 69.131,-7.79 68.731,-7.79 68.731,-7.99 69.131,-7.99
  rectangle: 69.731,-7.99 70.131,-7.79
  region: 70.131,-7.79 69.731,-7.79 69.731,-7.99 70.131,-7.99
  rectangle: 70.731,-7.99 71.131,-7.79
  region: 71.131,-7.79 70.731,-7.79 70.731,-7.99 71.131,-7.99
  rectangle: 71.731,-7.99 72.131,-7.79
  region: 72.131,-7.79 71.731,-7.79 71.731,-7.99 72.131,-7.99
  rectangle: 72.731,-7.99 73.131,-7.79
  region: 73.131,-7.79 72.731,-7.79 72.731,-7.99 73.131,-7.99
  rectangle: 73.731,-7.99 74.131,-7.79
  region: 74.131,-7.79 73.731,-7.79 73.731,-7.99 74.131,-7.99
Keep-Out Layer:
  lines w0.127: -54.244,22.01 -54.244,10.81 -52.794,10.81 cw(c-52.894,10.06) -52.144,9.96 -52.144,8.46 cw(c-52.794,8.46) -52.794,7.81 -54.244,7.81 -54.244,3.01 -52.794,3.01 cw(c-52.894,2.26) -52.144,2.16 -52.144,0.66 cw(c-52.794,0.66) -52.794,0.01 -54.244,0.01 -54.244,-7.99 -0.319,-7.99 -0.319,-4.94 ; -0.319,-4.94 cw(c0.431,-4.94) 1.181,-4.94 1.181,-7.99 79.106,-7.99 79.106,0.01 77.656,0.01 cw(c77.656,0.66) 77.006,0.66 77.006,2.16 cw(c77.755,2.26) 77.656,3.01 79.106,3.01 79.106,7.81 77.656,7.81 cw(c77.656,8.46) 77.006,8.46 77.006,9.96 cw(c77.756,10.06) 77.656,10.81 79.106,10.81 79.106,22.01

## EXBV8V [mm] "Chip Resistor Array, (0603x4); SM; 8 Leads; Body 3.40 x 1.80 mm (LxW max)"
height 0.7
pads (8):
  rect 0.45x0.7 smd: 1(-1.2,-0.75) 2(-0.4,-0.75) 3(0.4,-0.75) 4(1.2,-0.75) 5(1.2,0.75) 6(0.4,0.75) 7(-0.4,0.75) 8(-1.2,0.75)
Top Overlay:
  circle w0.1: c-1.7,-0.75 r0.05
  lines w0.2: -1.7,-0.35 -1.7,0.9 ; 1.7,-0.9 1.7,0.9

## FG484 [mm] "BGA, 484-Leads, Body 23x23mm, Pitch 1mm"
height 2.6
pads (484):
  round 0.5 smd: A1(-10.5,10.5) A2(-9.5,10.5) A3(-8.5,10.5) A4(-7.5,10.5) A5(-6.5,10.5) A6(-5.5,10.5) A7(-4.5,10.5) A8(-3.5,10.5) A9(-2.5,10.5) A10(-1.5,10.5) A11(-0.5,10.5) A12(0.5,10.5) A13(1.5,10.5) A14(2.5,10.5) A15(3.5,10.5) A16(4.5,10.5) A17(5.5,10.5) A18(6.5,10.5) A19(7.5,10.5) A20(8.5,10.5) A21(9.5,10.5) A22(10.5,10.5) AA1(-10.5,-9.5) AA2(-9.5,-9.5) AA3(-8.5,-9.5) AA4(-7.5,-9.5) AA5(-6.5,-9.5) AA6(-5.5,-9.5) AA7(-4.5,-9.5) AA8(-3.5,-9.5) AA9(-2.5,-9.5) AA10(-1.5,-9.5) AA11(-0.5,-9.5) AA12(0.5,-9.5) AA13(1.5,-9.5) AA14(2.5,-9.5) AA15(3.5,-9.5) AA16(4.5,-9.5) AA17(5.5,-9.5) AA18(6.5,-9.5) AA19(7.5,-9.5) AA20(8.5,-9.5) AA21(9.5,-9.5) AA22(10.5,-9.5) AB1(-10.5,-10.5) AB2(-9.5,-10.5) AB3(-8.5,-10.5) AB4(-7.5,-10.5) AB5(-6.5,-10.5) AB6(-5.5,-10.5) AB7(-4.5,-10.5) AB8(-3.5,-10.5) AB9(-2.5,-10.5) AB10(-1.5,-10.5) AB11(-0.5,-10.5) AB12(0.5,-10.5) AB13(1.5,-10.5) AB14(2.5,-10.5) AB15(3.5,-10.5) AB16(4.5,-10.5) AB17(5.5,-10.5) AB18(6.5,-10.5) AB19(7.5,-10.5) AB20(8.5,-10.5) AB21(9.5,-10.5) AB22(10.5,-10.5) B1(-10.5,9.5) B2(-9.5,9.5) B3(-8.5,9.5) B4(-7.5,9.5) B5(-6.5,9.5) B6(-5.5,9.5) B7(-4.5,9.5) B8(-3.5,9.5) B9(-2.5,9.5) B10(-1.5,9.5) B11(-0.5,9.5) B12(0.5,9.5) B13(1.5,9.5) B14(2.5,9.5) B15(3.5,9.5) B16(4.5,9.5) B17(5.5,9.5) B18(6.5,9.5) B19(7.5,9.5) B20(8.5,9.5) B21(9.5,9.5) B22(10.5,9.5) C1(-10.5,8.5) C2(-9.5,8.5) C3(-8.5,8.5) C4(-7.5,8.5) C5(-6.5,8.5) C6(-5.5,8.5) C7(-4.5,8.5) C8(-3.5,8.5) C9(-2.5,8.5) C10(-1.5,8.5) C11(-0.5,8.5) C12(0.5,8.5) C13(1.5,8.5) C14(2.5,8.5) C15(3.5,8.5) C16(4.5,8.5) C17(5.5,8.5) C18(6.5,8.5) C19(7.5,8.5) C20(8.5,8.5) C21(9.5,8.5) C22(10.5,8.5) D1(-10.5,7.5) D2(-9.5,7.5) D3(-8.5,7.5) D4(-7.5,7.5) D5(-6.5,7.5) D6(-5.5,7.5) D7(-4.5,7.5) D8(-3.5,7.5) D9(-2.5,7.5) D10(-1.5,7.5) D11(-0.5,7.5) D12(0.5,7.5) D13(1.5,7.5) D14(2.5,7.5) D15(3.5,7.5) D16(4.5,7.5) D17(5.5,7.5) D18(6.5,7.5) D19(7.5,7.5) D20(8.5,7.5) D21(9.5,7.5) D22(10.5,7.5) E1(-10.5,6.5) E2(-9.5,6.5) E3(-8.5,6.5) E4(-7.5,6.5) E5(-6.5,6.5) E6(-5.5,6.5) E7(-4.5,6.5) E8(-3.5,6.5) E9(-2.5,6.5) E10(-1.5,6.5) E11(-0.5,6.5) E12(0.5,6.5) E13(1.5,6.5) E14(2.5,6.5) E15(3.5,6.5) E16(4.5,6.5) E17(5.5,6.5) E18(6.5,6.5) E19(7.5,6.5) E20(8.5,6.5) E21(9.5,6.5) E22(10.5,6.5) F1(-10.5,5.5) F2(-9.5,5.5) F3(-8.5,5.5) F4(-7.5,5.5) F5(-6.5,5.5) F6(-5.5,5.5) F7(-4.5,5.5) F8(-3.5,5.5) F9(-2.5,5.5) F10(-1.5,5.5) F11(-0.5,5.5) F12(0.5,5.5) F13(1.5,5.5) F14(2.5,5.5) F15(3.5,5.5) F16(4.5,5.5) F17(5.5,5.5) F18(6.5,5.5) F19(7.5,5.5) F20(8.5,5.5) F21(9.5,5.5) F22(10.5,5.5) G1(-10.5,4.5) G2(-9.5,4.5) G3(-8.5,4.5) G4(-7.5,4.5) G5(-6.5,4.5) G6(-5.5,4.5) G7(-4.5,4.5) G8(-3.5,4.5) G9(-2.5,4.5) G10(-1.5,4.5) G11(-0.5,4.5) G12(0.5,4.5) G13(1.5,4.5) G14(2.5,4.5) G15(3.5,4.5) G16(4.5,4.5) G17(5.5,4.5) G18(6.5,4.5) G19(7.5,4.5) G20(8.5,4.5) G21(9.5,4.5) G22(10.5,4.5) H1(-10.5,3.5) H2(-9.5,3.5) H3(-8.5,3.5) H4(-7.5,3.5) H5(-6.5,3.5) H6(-5.5,3.5) H7(-4.5,3.5) H8(-3.5,3.5) H9(-2.5,3.5) H10(-1.5,3.5) H11(-0.5,3.5) H12(0.5,3.5) H13(1.5,3.5) H14(2.5,3.5) H15(3.5,3.5) H16(4.5,3.5) H17(5.5,3.5) H18(6.5,3.5) H19(7.5,3.5) H20(8.5,3.5) H21(9.5,3.5) H22(10.5,3.5) J1(-10.5,2.5) J2(-9.5,2.5) J3(-8.5,2.5) J4(-7.5,2.5) J5(-6.5,2.5) J6(-5.5,2.5) J7(-4.5,2.5) J8(-3.5,2.5) J9(-2.5,2.5) J10(-1.5,2.5) J11(-0.5,2.5) J12(0.5,2.5) J13(1.5,2.5) J14(2.5,2.5) J15(3.5,2.5) J16(4.5,2.5) J17(5.5,2.5) J18(6.5,2.5) J19(7.5,2.5) J20(8.5,2.5) J21(9.5,2.5) J22(10.5,2.5) K1(-10.5,1.5) K2(-9.5,1.5) K3(-8.5,1.5) K4(-7.5,1.5) K5(-6.5,1.5) K6(-5.5,1.5) K7(-4.5,1.5) K8(-3.5,1.5) K9(-2.5,1.5) K10(-1.5,1.5) K11(-0.5,1.5) K12(0.5,1.5) K13(1.5,1.5) K14(2.5,1.5) K15(3.5,1.5) K16(4.5,1.5) K17(5.5,1.5) K18(6.5,1.5) K19(7.5,1.5) K20(8.5,1.5) K21(9.5,1.5) K22(10.5,1.5) L1(-10.5,0.5) L2(-9.5,0.5) L3(-8.5,0.5) L4(-7.5,0.5) L5(-6.5,0.5) L6(-5.5,0.5) L7(-4.5,0.5) L8(-3.5,0.5) L9(-2.5,0.5) L10(-1.5,0.5) L11(-0.5,0.5) L12(0.5,0.5) L13(1.5,0.5) L14(2.5,0.5) L15(3.5,0.5) L16(4.5,0.5) L17(5.5,0.5) L18(6.5,0.5) L19(7.5,0.5) L20(8.5,0.5) L21(9.5,0.5) L22(10.5,0.5) M1(-10.5,-0.5) M2(-9.5,-0.5) M3(-8.5,-0.5) M4(-7.5,-0.5) M5(-6.5,-0.5) M6(-5.5,-0.5) M7(-4.5,-0.5) M8(-3.5,-0.5) M9(-2.5,-0.5) M10(-1.5,-0.5) M11(-0.5,-0.5) M12(0.5,-0.5) M13(1.5,-0.5) M14(2.5,-0.5) M15(3.5,-0.5) M16(4.5,-0.5) M17(5.5,-0.5) M18(6.5,-0.5) M19(7.5,-0.5) M20(8.5,-0.5) M21(9.5,-0.5) M22(10.5,-0.5) N1(-10.5,-1.5) N2(-9.5,-1.5) N3(-8.5,-1.5) N4(-7.5,-1.5) N5(-6.5,-1.5) N6(-5.5,-1.5) N7(-4.5,-1.5) N8(-3.5,-1.5) N9(-2.5,-1.5) N10(-1.5,-1.5) N11(-0.5,-1.5) N12(0.5,-1.5) N13(1.5,-1.5) N14(2.5,-1.5) N15(3.5,-1.5) N16(4.5,-1.5) N17(5.5,-1.5) N18(6.5,-1.5) N19(7.5,-1.5) N20(8.5,-1.5) N21(9.5,-1.5) N22(10.5,-1.5) P1(-10.5,-2.5) P2(-9.5,-2.5) P3(-8.5,-2.5) P4(-7.5,-2.5) P5(-6.5,-2.5) P6(-5.5,-2.5) P7(-4.5,-2.5) P8(-3.5,-2.5) P9(-2.5,-2.5) P10(-1.5,-2.5) P11(-0.5,-2.5) P12(0.5,-2.5) P13(1.5,-2.5) P14(2.5,-2.5) P15(3.5,-2.5) P16(4.5,-2.5) P17(5.5,-2.5) P18(6.5,-2.5) P19(7.5,-2.5) P20(8.5,-2.5) P21(9.5,-2.5) P22(10.5,-2.5) R1(-10.5,-3.5) R2(-9.5,-3.5) R3(-8.5,-3.5) R4(-7.5,-3.5) R5(-6.5,-3.5) R6(-5.5,-3.5) R7(-4.5,-3.5) R8(-3.5,-3.5) R9(-2.5,-3.5) R10(-1.5,-3.5) R11(-0.5,-3.5) R12(0.5,-3.5) R13(1.5,-3.5) R14(2.5,-3.5) R15(3.5,-3.5) R16(4.5,-3.5) R17(5.5,-3.5) R18(6.5,-3.5) R19(7.5,-3.5) R20(8.5,-3.5) R21(9.5,-3.5) R22(10.5,-3.5) T1(-10.5,-4.5) T2(-9.5,-4.5) T3(-8.5,-4.5) T4(-7.5,-4.5) T5(-6.5,-4.5) T6(-5.5,-4.5) T7(-4.5,-4.5) T8(-3.5,-4.5) T9(-2.5,-4.5) T10(-1.5,-4.5) T11(-0.5,-4.5) T12(0.5,-4.5) T13(1.5,-4.5) T14(2.5,-4.5) T15(3.5,-4.5) T16(4.5,-4.5) T17(5.5,-4.5) T18(6.5,-4.5) T19(7.5,-4.5) T20(8.5,-4.5) T21(9.5,-4.5) T22(10.5,-4.5) U1(-10.5,-5.5) U2(-9.5,-5.5) U3(-8.5,-5.5) U4(-7.5,-5.5) U5(-6.5,-5.5) U6(-5.5,-5.5) U7(-4.5,-5.5) U8(-3.5,-5.5) U9(-2.5,-5.5) U10(-1.5,-5.5) U11(-0.5,-5.5) U12(0.5,-5.5) U13(1.5,-5.5) U14(2.5,-5.5) U15(3.5,-5.5) U16(4.5,-5.5) U17(5.5,-5.5) U18(6.5,-5.5) U19(7.5,-5.5) U20(8.5,-5.5) U21(9.5,-5.5) U22(10.5,-5.5) V1(-10.5,-6.5) V2(-9.5,-6.5) V3(-8.5,-6.5) V4(-7.5,-6.5) V5(-6.5,-6.5) V6(-5.5,-6.5) V7(-4.5,-6.5) V8(-3.5,-6.5) V9(-2.5,-6.5) V10(-1.5,-6.5) V11(-0.5,-6.5) V12(0.5,-6.5) V13(1.5,-6.5) V14(2.5,-6.5) V15(3.5,-6.5) V16(4.5,-6.5) V17(5.5,-6.5) V18(6.5,-6.5) V19(7.5,-6.5) V20(8.5,-6.5) V21(9.5,-6.5) V22(10.5,-6.5) W1(-10.5,-7.5) W2(-9.5,-7.5) W3(-8.5,-7.5) W4(-7.5,-7.5) W5(-6.5,-7.5) W6(-5.5,-7.5) W7(-4.5,-7.5) W8(-3.5,-7.5) W9(-2.5,-7.5) W10(-1.5,-7.5) W11(-0.5,-7.5) W12(0.5,-7.5) W13(1.5,-7.5) W14(2.5,-7.5) W15(3.5,-7.5) W16(4.5,-7.5) W17(5.5,-7.5) W18(6.5,-7.5) W19(7.5,-7.5) W20(8.5,-7.5) W21(9.5,-7.5) W22(10.5,-7.5) Y1(-10.5,-8.5) Y2(-9.5,-8.5) Y3(-8.5,-8.5) Y4(-7.5,-8.5) Y5(-6.5,-8.5) Y6(-5.5,-8.5) Y7(-4.5,-8.5) Y8(-3.5,-8.5) Y9(-2.5,-8.5) Y10(-1.5,-8.5) Y11(-0.5,-8.5) Y12(0.5,-8.5) Y13(1.5,-8.5) Y14(2.5,-8.5) Y15(3.5,-8.5) Y16(4.5,-8.5) Y17(5.5,-8.5) Y18(6.5,-8.5) Y19(7.5,-8.5) Y20(8.5,-8.5) Y21(9.5,-8.5) Y22(10.5,-8.5)
Top Overlay:
  circle w0.25: c-12.15,10.5 r0.125
  region: -10.5,11.5 -11.5,10.5 -11.5,11.5
  lines w0.2: -11.5,10.5 -10.5,11.5 ; -11.5,-11.5 -11.5,11.5 11.5,11.5 11.5,-11.5 -11.5,-11.5
Mechanical 13:
  lines w0.1: -11.5,-11.5 -11.5,11.5 11.5,11.5 11.5,-11.5 -11.5,-11.5
Mechanical 15:
  lines w0.1: -0.5,0 0.5,0 ; 0,-0.5 0,0.5 ; -12.5,-12.5 -12.5,12.5 12.5,12.5 12.5,-12.5 -12.5,-12.5
3D body: height 2.6, standoff 0, extent -11.5,-11.5 11.5,11.5

## HDR1X6 [mm] "Connector; Header; 6 Position"
pads (6):
  rect 1.5x1.5 hole 0.9: 1(0,0)
  round 1.5 hole 0.9: 2(2.54,0) 3(5.08,0) 4(7.62,0) 5(10.16,0) 6(12.7,0)
Top Overlay:
  lines w0.2: -1.27,-1.27 -1.27,1.27 13.97,1.27 13.97,-1.27 -1.27,-1.27

## IHLP4040 [mm]
pads (2):
  rect 3.5x4.95 smd: 1(-4.75,0) 2(4.75,0)
Top Overlay:
  lines w0.254: -5.46,-2.794 -5.46,-5.15 5.46,-5.15 5.46,-2.794 ; -5.46,2.794 -5.46,5.15 5.46,5.15 5.46,2.794